# Altium schematic symbol library LATTICEPLDS_Library.SchLib: 291 symbols (part 13 of 32) (continued)
## LFE3-70/95/150EA-FN1156 (continued)
part D pins: AA25 PR64A*||PR82A*_RDQ67|RDQ85 (io), AA26 PR64B*||PR82B*_RDQ67|RDQ85 (io), AA27 PR70B*||PR88B*_RDQ67|RDQ85 (io), AA28 PR70A*||PR88A*_RDQ67|RDQ85 (io), AA29 PR58B||PR76B_RDQS58_N|RDQS76_N (io), AA30 PR65B*||PR83B*_RDQ67|RDQ85 (io), AA31 PR65A*||PR83A*_RDQ67|RDQ85 (io), AA33 PR61E_B,RLM1_GPLLT_FB_B||PR79E_B,RLM1_GPLLT_FB_B_RDQ58|RDQ76 (in), AA34 PR61E_A,RLM1_GPLLT_FB_A||PR79E_A,RLM1_GPLLT_FB_A_RDQ58|RDQ76 (in), AB23 VCCIO3 (power), AB24 VCCIO3 (power), AB25 NC||PR94B_|RDQS94_N (io), AB26 NC||PR94A_|RDQS94_P (io), AB27 NC||PR100B*_|RDQ103 (io), AB28 PR70E_C,RLM2_GPLLT_IN_A||PR97E_C,RLM3_GPLLT_IN_A_RDQ67|RDQ94 (in), AB29 PR70E_D,RLM2_GPLLT_IN_B||PR97E_D,RLM3_GPLLT_IN_B_RDQ67|RDQ94 (in), AB30 PR67A||PR85A_RDQS67_P|RDQS85_P (io), AB31 NC||PR89B_|RDQ94 (io), AB32 NC||PR89A_|RDQ94 (io), AB33 PR62B||PR80B_RDQ67|RDQ85 (io), AB34 PR62A||PR80A_RDQ67|RDQ85 (io), AC25 NC||PR103A_|RDQS103_P (io), AC26 NC||PR103B_|RDQS103_N (io), AC28 NC||PR100A*_|RDQ103 (io), AC30 PR67B||PR85B_RDQS67_N|RDQS85_N (io), AC31 PR70E_B,RLM2_GPLLT_FB_B||PR97E_B,RLM3_GPLLT_FB_B_RDQ67|RDQ94 (in), AC32 PR70E_A,RLM2_GPLLT_FB_A||PR97E_A,RLM3_GPLLT_FB_A_RDQ67|RDQ94 (in), AC33 PR68B||PR86B_RDQ67|RDQ85 (io), AC34 PR68A||PR86A_RDQ67|RDQ85 (io), AD25 NC||PR106B*_|RDQ103 (io), AD26 NC||PR106A*_|RDQ103 (io), AD30 NC||PR91B*_|RDQ94 (io), AD31 NC||PR91A*_|RDQ94 (io), AD33 NC||PR97A*_|RDQ94 (io), AD34 NC||PR97B*_|RDQ94 (io), AE26 PB145B||PB181B (io), AE29 PR74B*||PR101B*_RDQ76|RDQ103 (io), AE30 PR74A*||PR101A*_RDQ76|RDQ103 (io), AE31 PR71B||PR98B_RDQ76|RDQ103 (io), AE32 PR71A||PR98A_RDQ76|RDQ103 (io), AE33 NC||PR92B*_|RDQ94 (io), AE34 NC||PR92A*_|RDQ94 (io), AF26 PB145A||PB181A (io), AF31 PR77B||PR104B_RDQ76|RDQ103 (io), AF32 PR77A||PR104A_RDQ76|RDQ103 (io), AF34 NC||PR95A_|RDQ94 (io), AG26 PB136B||PB172B (io), AG34 NC||PR95B_|RDQ94 (io), AH26 PB136A||PB172A (io), AH27 PB142A||PB178A (io), AH28 PB142B||PB178B (io), AH33 PR82A*||PR109A*_RDQ85|RDQ112 (io), AJ27 PB139B||PB175B (io), AJ28 PB140B||PB176B (io), AJ31 PR88A*||PR115A*_RDQ85|RDQ112 (io), AJ33 PR82B*||PR109B*_RDQ85|RDQ112 (io), AJ34 PR79E_C,RLM3_GPLLT_IN_A||PR106E_C,RLM4_GPLLT_IN_A_RDQ76|RDQ103 (in), AK27 PB139A||PB175A (io), AK28 PB140A||PB176A (io), AK29 PB143B||PB179B (io), AK31 PR88B*||PR115B*_RDQ85|RDQ112 (io), AK32 PR86B||PR113B_RDQ85|RDQ112 (io), AK34 PR79E_D,RLM3_GPLLT_IN_B||PR106E_D,RLM4_GPLLT_IN_B_RDQ76|RDQ103 (in), AL27 PB134B||PB170B (io), AL28 PB137B||PB173B (io), AL29 PB143A||PB179A (io), AL30 PR91A*||PR118A*_RDQ94|RDQ121 (io), AL31 PR95A||PR122A_RDQ94|RDQ121 (io), AL32 PR86A||PR113A_RDQ85|RDQ112 (io), AL33 PR85B||PR112B_RDQS85_N|RDQS112_N (io), AL34 PR85A||PR112A_RDQS85_P|RDQS112_P (io), AM27 PB134A||PB170A (io), AM28 PB137A||PB173A (io), AM29 PR97A*||PR124A*_RDQ94|RDQ121 (io), AM30 PR91B*||PR118B*_RDQ94|RDQ121 (io), AM31 PR95B||PR122B_RDQ94|RDQ121 (io), AM32 PR89B||PR116B_RDQ94|RDQ121 (io), AM33 PR79E_B,RLM3_GPLLT_FB_B||PR106E_B,RLM4_GPLLT_FB_B_RDQ76|RDQ103 (in), AM34 PR79E_A,RLM3_GPLLT_FB_A||PR106E_A,RLM4_GPLLT_FB_A_RDQ76|RDQ103 (in), AN27 PB133B||PB169B (io), AN28 PB131B||PB167B (io), AN29 PR97B*||PR124B*_RDQ94|RDQ121 (io), AN31 PR92B*||PR119B*_RDQ94|RDQ121 (io), AN32 PR89A||PR116A_RDQ94|RDQ121 (io), AN33 PR80B||PR107B_RDQ85|RDQ112 (io), AN34 PR80A||PR107A_RDQ85|RDQ112 (io), AP27 PB133A||PB169A (io), AP28 PB131A||PB167A (io), AP29 PR94A||PR121A_RDQS94_P|RDQS121_P (io), AP30 PR94B||PR121B_RDQS94_N|RDQS121_N (io), AP31 PR92A*||PR119A*_RDQ94|RDQ121 (io), AP32 PR83B*||PR110B*_RDQ85|RDQ112 (io), AP33 PR83A*||PR110A*_RDQ85|RDQ112 (io), U28 PR46A*,PCLKT3_0||PR64A*,PCLKT3_0_RDQ49|RDQ67 (io), V23 VCCIO3 (power), V24 VCCIO3 (power), V26 PR49B||PR67B_RDQS49_N|RDQS67_N (io), V27 PR49A||PR67A_RDQS49_P|RDQS67_P (io), V28 PR46B*,PCLKC3_0||PR64B*,PCLKC3_0_RDQ49|RDQ67 (io), V29 PR52A*,VREF1_3||PR70A*,VREF1_3_RDQ49|RDQ67 (io), V30 PR44B||PR62B_RDQ49|RDQ67 (io), V31 PR44A||PR62A_RDQ49|RDQ67 (io), W26 PR55B*||PR73B*_RDQ58|RDQ76 (io), W27 PR55A*||PR73A*_RDQ58|RDQ76 (io), W28 PR52B*,VREF2_3||PR70B*,VREF2_3_RDQ49|RDQ67 (io), W29 PR53B||PR71B_RDQ58|RDQ76 (io), W30 PR53A||PR71A_RDQ58|RDQ76 (io), W31 PR50B||PR68B_RDQ49|RDQ67 (io), W32 PR50A||PR68A_RDQ49|RDQ67 (io), W33 PR47B*||PR65B*_RDQ49|RDQ67 (io), W34 PR47A*||PR65A*_RDQ49|RDQ67 (io), Y25 PR61B*||PR79B*_RDQ58|RDQ76 (io), Y26 PR61A*||PR79A*_RDQ58|RDQ76 (io), Y27 PR61E_D,RLM1_GPLLT_IN_B||PR79E_D,RLM1_GPLLT_IN_B_RDQ58|RDQ76 (in), Y28 PR61E_C,RLM1_GPLLT_IN_A||PR79E_C,RLM1_GPLLT_IN_A_RDQ58|RDQ76 (in), Y30 PR58A||PR76A_RDQS58_P|RDQS76_P (io), Y31 PR59B||PR77B_RDQ58|RDQ76 (io), Y32 PR59A||PR77A_RDQ58|RDQ76 (io), Y33 PR56B*||PR74B*_RDQ58|RDQ76 (io), Y34 PR56A*||PR74A*_RDQ58|RDQ76 (io)
part E pins: AA1 PL62B||PL80B_LDQ67|LDQ85 (io), AA2 PL62A||PL80A_LDQ67|LDQ85 (io), AA3 PL65B*||PL83B*_LDQ67|LDQ85 (io), AA4 PL65A*||PL83A*_LDQ67|LDQ85 (io), AA5 PL70A*||PL88A*_LDQ67|LDQ85 (io), AA7 PL64B*||PL82B*_LDQ67|LDQ85 (io), AA8 PL61B*||PL79B*_LDQ58|LDQ76 (io), AA9 NC||PL97A*_|LDQ94 (io), AA10 PL67A||PL85A_LDQS67_P|LDQS85_P (io), AB1 PL68B||PL86B_LDQ67|LDQ85 (io), AB2 PL68A||PL86A_LDQ67|LDQ85 (io), AB3 NC||PL89B_|LDQ94 (io), AB4 NC||PL89A_|LDQ94 (io), AB5 PL70B*||PL88B*_LDQ67|LDQ85 (io), AB6 NC||PL91B*_|LDQ94 (io), AB7 NC||PL91A*_|LDQ94 (io), AB8 NC||PL97B*_|LDQ94 (io), AB9 PL67B||PL85B_LDQS67_N|LDQS85_N (io), AB10 NC||PL100A*_|LDQ103 (io), AB11 VCCIO6 (power), AB12 VCCIO6 (power), AC1 NC||PL92B*_|LDQ94 (io), AC2 NC||PL92A*_|LDQ94 (io), AC4 NC||PL95B_|LDQ94 (io), AC5 NC||PL95A_|LDQ94 (io), AC6 PL70E_C,LLM2_GPLLT_IN_A||PL97E_C,LLM3_GPLLT_IN_A (in), AC7 PL70E_D,LLM2_GPLLT_IN_B||PL97E_D,LLM3_GPLLT_IN_B (in), AC8 NC||PL106B*_|LDQ103 (io), AC9 NC||PL106A*_|LDQ103 (io), AC10 NC||PL100B*_|LDQ103 (io), AD1 PL70E_B,LLM2_GPLLT_FB_B||PL97E_B,LLM3_GPLLT_FB_B (in), AD2 PL70E_A,LLM2_GPLLT_FB_A||PL97E_A,LLM3_GPLLT_FB_A (in), AD3 PL71B||PL98B_LDQ76|LDQ103 (io), AD4 PL71A||PL98A_LDQ76|LDQ103 (io), AD5 NC||PL94A_|LDQS94_P (io), AD8 PL82B*||PL109B*_LDQ85|LDQ112 (io), AD9 PL82A*||PL109A*_LDQ85|LDQ112 (io), AD10 PB4B||PB4B (io), AE1 PL74B*||PL101B*_LDQ76|LDQ103 (io), AE2 PL74A*||PL101A*_LDQ76|LDQ103 (io), AE3 PL77B||PL104B_LDQ76|LDQ103 (io), AE4 PL77A||PL104A_LDQ76|LDQ103 (io), AE5 NC||PL94B_|LDQS94_N (io), AE9 PB4A||PB4A (io), AF9 PB7A||PB7A (io), AG9 PB7B||PB7B (io), AH7 PB2A||PB2A (io), AH9 PB13A||PB13A (io), AJ1 NC||PL103A_|LDQS103_P (io), AJ2 PL85A||PL112A_LDQS85_P|LDQS112_P (io), AJ3 PL85B||PL112B_LDQS85_N|LDQS112_N (io), AJ4 PL88A*||PL115A*_LDQ85|LDQ112 (io), AJ5 PL91A*||PL118A*_LDQ94|LDQ121 (io), AJ6 PL91B*||PL118B*_LDQ94|LDQ121 (io), AJ7 PB2B||PB2B (io), AJ8 PB13B||PB13B (io), AK1 NC||PL103B_|LDQS103_N (io), AK3 PL86B||PL113B_LDQ85|LDQ112 (io), AK4 PL88B*||PL115B*_LDQ85|LDQ112 (io), AK6 PB5A||PB5A (io), AK7 PB8A||PB8A (io), AK8 PB10A||PB10A (io), AL1 PL79E_C,LLM3_GPLLT_IN_A||PL106E_C,LLM4_GPLLT_IN_A (in), AL2 PL79E_D,LLM3_GPLLT_IN_B||PL106E_D,LLM4_GPLLT_IN_B (in), AL3 PL86A||PL113A_LDQ85|LDQ112 (io), AL4 PL95A||PL122A_LDQ94|LDQ121 (io), AL5 PL92A*||PL119A*_LDQ94|LDQ121 (io), AL6 PB5B||PB5B (io), AL7 PB8B||PB8B (io), AL8 PB10B||PB10B (io), AM1 PL79E_A,LLM3_GPLLT_FB_A||PL106E_A,LLM4_GPLLT_FB_A (in), AM2 PL79E_B,LLM3_GPLLT_FB_B||PL106E_B,LLM4_GPLLT_FB_B (in), AM3 PL89B||PL116B_LDQ94|LDQ121 (io), AM4 PL95B||PL122B_LDQ94|LDQ121 (io), AM5 PL92B*||PL119B*_LDQ94|LDQ121 (io), AM6 PL94A||PL121A_LDQS94_P|LDQS121_P (io), AM7 PB11A||PB11A (io), AM8 PB11B||PB11B (io), AN1 PL80A||PL107A_LDQ85|LDQ112 (io), AN2 PL80B||PL107B_LDQ85|LDQ112 (io), AN3 PL89A||PL116A_LDQ94|LDQ121 (io), AN6 PL94B||PL121B_LDQS94_N|LDQS121_N (io), AN7 PB14A||PB14A (io), AN8 PB16A||PB16A (io), AP2 PL83A*||PL110A*_LDQ85|LDQ112 (io), AP3 PL83B*||PL110B*_LDQ85|LDQ112 (io), AP5 PL97A*||PL124A*_LDQ94|LDQ121 (io), AP6 PL97B*||PL124B*_LDQ94|LDQ121 (io), AP7 PB14B||PB14B (io), AP8 PB16B||PB16B (io), U1 PL44B||PL62B_LDQ49|LDQ67 (io), U2 PL44A||PL62A_LDQ49|LDQ67 (io), V1 PL47B*||PL65B*_LDQ49|LDQ67 (io), V2 PL47A*||PL65A*_LDQ49|LDQ67 (io), V3 PL50B||PL68B_LDQ49|LDQ67 (io), V4 PL50A||PL68A_LDQ49|LDQ67 (io), V5 PL49A||PL67A_LDQS49_P|LDQS67_P (io), V7 PL52A*,VREF1_6||PL70A*,VREF1_6_LDQ49|LDQ67 (io), V8 PL46B*,PCLKC6_0||PL64B*,PCLKC6_0_LDQ49|LDQ67 (io), V9 PL46A*,PCLKT6_0||PL64A*,PCLKT6_0_LDQ49|LDQ67 (io), V11 VCCIO6 (power), V12 VCCIO6 (power), W1 PL53B||PL71B_LDQ58|LDQ76 (io), W2 PL53A||PL71A_LDQ58|LDQ76 (io), W3 PL56B*||PL74B*_LDQ58|LDQ76 (io), W4 PL56A*||PL74A*_LDQ58|LDQ76 (io), W5 PL49B||PL67B_LDQS49_N|LDQS67_N (io), W6 PL58A||PL76A_LDQS58_P|LDQS76_P (io), W7 PL52B*,VREF2_6||PL70B*,VREF2_6_LDQ49|LDQ67 (io), W8 PL55A*||PL73A*_LDQ58|LDQ76 (io), W9 PL55B*||PL73B*_LDQ58|LDQ76 (io), Y1 PL59B||PL77B_LDQ58|LDQ76 (io), Y2 PL59A||PL77A_LDQ58|LDQ76 (io), Y4 PL61E_B,LLM1_GPLLT_FB_B||PL79E_B,LLM1_GPLLT_FB_B (in), Y5 PL61E_A,LLM1_GPLLT_FB_A||PL79E_A,LLM1_GPLLT_FB_A (in), Y6 PL58B||PL76B_LDQS58_N|LDQS76_N (io), Y7 PL64A*||PL82A*_LDQ67|LDQ85 (io), Y8 PL61A*||PL79A*_LDQ58|LDQ76 (io), Y9 PL61E_C,LLM1_GPLLT_IN_A||PL79E_C,LLM1_GPLLT_IN_A (in), Y10 PL61E_D,LLM1_GPLLT_IN_B||PL79E_D,LLM1_GPLLT_IN_B (in)
part F pins: E3 PL10B*||PL10B*_LDQ13|LDQ13 (io), F1 PL8B||PL8B_LDQ13|LDQ13 (io), F2 PL8A||PL8A_LDQ13|LDQ13 (io), F3 PL10A*||PL10A*_LDQ13|LDQ13 (io), G1 PL11B*||PL11B*_LDQ13|LDQ13 (io), G2 PL11A*||PL11A*_LDQ13|LDQ13 (io), G3 PL13A||PL13A_LDQS13_P|LDQS13_P (io), G4 PL2A||PL2A (io), G5 PL2B||PL2B (io), H1 PL14A||PL14A_LDQ13|LDQ13 (io), H2 PL16B*||PL16B*_LDQ13|LDQ13 (io), H3 PL13B||PL13B_LDQS13_N|LDQS13_N (io), H4 PL5B||PL5B (io), H5 PL5A||PL5A (io), J1 PL14B||PL14B_LDQ13|LDQ13 (io), J3 PL16A*||PL16A*_LDQ13|LDQ13 (io), J6 NC||PL19B*_|LDQ22 (io), K1 NC||PL20B*_|LDQ22 (io), K2 NC||PL20A*_|LDQ22 (io), K3 NC||PL17B_|LDQ22 (io), K4 NC||PL17A_|LDQ22 (io), K5 NC||PL28B*_|LDQ31 (io), K6 NC||PL28A*_|LDQ31 (io), K7 NC||PL19A*_|LDQ22 (io), K8 PL4B*||NC, K9 PL4A*||NC, L1 NC||PL23B_|LDQ22 (io), L2 NC||PL23A_|LDQ22 (io), L4 NC||PL26B_|LDQ31 (io), L5 NC||PL26A_|LDQ31 (io), L6 NC||PL34B*_|LDQ31 (io), L7 NC||PL25B*_|LDQ22 (io), L9 NC||PL22B_|LDQS22_N (io), L10 NC||PL22A_|LDQS22_P (io), M1 NC||PL32B_|LDQ31 (io), M2 NC||PL32A_|LDQ31 (io), M3 NC||PL29B*_|LDQ31 (io), M4 NC||PL29A*_|LDQ31 (io), M5 PL19A*||PL37A*_LDQ22|LDQ40 (io), M7 NC||PL34A*_|LDQ31 (io), M8 NC||PL25A*_|LDQ22 (io), M9 NC||PL31B_|LDQS31_N (io), M10 PL22A||PL40A_LDQS22_P|LDQS40_P (io), N1 PL20B*||PL38B*_LDQ22|LDQ40 (io), N2 PL20A*||PL38A*_LDQ22|LDQ40 (io), N3 PL17B||PL35B_LDQ22|LDQ40 (io), N4 PL17A||PL35A_LDQ22|LDQ40 (io), N5 PL19B*||PL37B*_LDQ22|LDQ40 (io), N6 PL25E_D,LUM2_GPLLT_IN_B||PL43E_D,LUM2_GPLLT_IN_B (in), N7 PL25E_C,LUM2_GPLLT_IN_A||PL43E_C,LUM2_GPLLT_IN_A (in), N8 PL25A*||PL43A*_LDQ22|LDQ40 (io), N9 NC||PL31A_|LDQS31_P (io), N10 PL22B||PL40B_LDQS22_N|LDQS40_N (io), N11 VCCIO7 (power), N12 VCCIO7 (power), P1 PL25E_B,LUM2_GPLLT_FB_B||PL43E_B,LUM2_GPLLT_FB_B (in), P2 PL25E_A,LUM2_GPLLT_FB_A||PL43E_A,LUM2_GPLLT_FB_A (in), P4 PL23B||PL41B_LDQ22|LDQ40 (io), P5 PL23A||PL41A_LDQ22|LDQ40 (io), P6 PL31B||PL49B_LDQS31_N|LDQS49_N (io), P7 PL31A||PL49A_LDQS31_P|LDQS49_P (io), P8 PL25B*||PL43B*_LDQ22|LDQ40 (io), P9 PL28A*||PL46A*_LDQ31|LDQ49 (io), P10 PL28B*||PL46B*_LDQ31|LDQ49 (io), R1 PL29B*||PL47B*_LDQ31|LDQ49 (io), R2 PL29A*||PL47A*_LDQ31|LDQ49 (io), R3 PL32B||PL50B_LDQ31|LDQ49 (io), R4 PL32A||PL50A_LDQ31|LDQ49 (io), R5 PL26B||PL44B_LDQ31|LDQ49 (io), R7 PL26A||PL44A_LDQ31|LDQ49 (io), R8 PL37A*,LUM0_GDLLT_IN_A||PL55A*,LUM0_GDLLT_IN_A_LDQ40|LDQ58 (io), R9 PL34A*,VREF1_7||PL52A*,VREF1_7_LDQ31|LDQ49 (io), R10 PL34B*,VREF2_7||PL52B*,VREF2_7_LDQ31|LDQ49 (io), T1 PL41B||PL59B_LDQ40|LDQ58 (io), T2 PL41A||PL59A_LDQ40|LDQ58 (io), T3 PL38B*,LUM0_GDLLT_FB_B||PL56B*,LUM0_GDLLT_FB_B_LDQ40|LDQ58 (io), T4 PL38A*,LUM0_GDLLT_FB_A||PL56A*,LUM0_GDLLT_FB_A_LDQ40|LDQ58 (io), T5 PL35B||PL53B_LDQ40|LDQ58 (io), T6 PL35A||PL53A_LDQ40|LDQ58 (io), T7 PL37B*,LUM0_GDLLT_IN_B||PL55B*,LUM0_GDLLT_IN_B_LDQ40|LDQ58 (io), T8 PL40B||PL58B_LDQS40_N|LDQS58_N (io), T9 PL40A||PL58A_LDQS40_P|LDQS58_P (io), U4 PL43E_B,LUM0_GPLLT_FB_B||PL61E_B,LUM0_GPLLT_FB_B (in), U5 PL43E_A,LUM0_GPLLT_FB_A||PL61E_A,LUM0_GPLLT_FB_A (in), U6 PL43E_C,LUM0_GPLLT_IN_A||PL61E_C,LUM0_GPLLT_IN_A (in), U7 PL43E_D,LUM0_GPLLT_IN_B||PL61E_D,LUM0_GPLLT_IN_B (in), U8 PL43B*,PCLKC7_0||PL61B*,PCLKC7_0_LDQ40|LDQ58 (io), U9 PL43A*,PCLKT7_0||PL61A*,PCLKT7_0_LDQ40|LDQ58 (io), U11 VCCIO7 (power), U12 VCCIO7 (power)
part G pins: A32 PT140A||PT176A (io), A33 PT140B||PT176B (io), B32 PT143A||PT179A (io), B33 CFG0 (in), B34 PROGRAMN||PROGRAMN (in), C1 TDO (out), C31 PT145B||PT181B (io), C32 PT143B||PT179B (io), C33 INITN (io), C34 CCLK (in), D1 TCK (in), D2 TMS (in), D29 PT142B||PT178B (io), D30 PT142A||PT178A (io), D31 PT145A||PT181A (io), D32 CFG2 (in), D33 PR5A||PR5A (io), D34 PR5B,DI/CSSPI0N/CSSPIN||PR5B,DI/CSSPI0N/CSSPIN (io), E1 TDI (in), E31 PR10A,WRITEN||PR10A,WRITEN (io), E32 PR10B,D0/SPIFASTN||PR10B,D0/SPIFASTN (io), E34 PR8A,DOUT/CSON/CSSPI1N||PR8A,DOUT/CSON/CSSPI1N (io), F30 CFG1 (in), F31 PR7B,CSN/SN/CONT1N||PR7B,CSN/SN/CONT1N (io), F32 PR16A,D7/SPID0||PR16A,D7/SPID0 (io), F33 PR16B,BUSY/SISPI||PR16B,BUSY/SISPI (io), F34 PR8B,MCLK||PR8B (io), G30 PR7A,CS1N/HOLDN/CONT2N||PR7A,CS1N/HOLDN/CONT2N (io), G31 DONE (io), G32 PR13B,D4/SO||PR13B,D4/SO (io), G33 PR13A,D3/SI||PR13A,D3/SI (io), G34 PR11A,D1||PR11A,D1 (io), H33 PR11B,D2||PR11B,D2 (io), H34 PR14A,D5||PR14A,D5 (io), J34 PR14B,D6/SPID1||PR14B,D6/SPID1 (io), K10 VCCJ (power), N25 VCCIO8||VCCIO8 (power), P25 VCCIO8||VCCIO8 (power)
part H pins: AE14 NC||PCSD_VCCOB0 (power), AE15 NC||PCSD_VCCIB0 (power), AE20 PCSC_VCCIB3||PCSC_VCCIB3 (power), AE21 PCSC_VCCOB3||PCSC_VCCOB3 (power), AF11 NC||PCSD_VCCIB3 (power), AF12 NC||PCSD_VCCIB2 (power), AF13 NC||PCSD_VCCIB1 (power), AF14 PCSB_VCCIB3||PCSB_VCCIB3 (power), AF15 PCSB_VCCIB2||PCSB_VCCIB2 (power), AF16 PCSB_VCCIB1||PCSB_VCCIB1 (power), AF17 PCSB_VCCIB0||PCSB_VCCIB0 (power), AF18 PCSA_VCCIB3||PCSA_VCCIB3 (power), AF19 PCSA_VCCIB2||PCSA_VCCIB2 (power), AF20 PCSA_VCCIB1||PCSA_VCCIB1 (power), AF21 PCSA_VCCIB0||PCSA_VCCIB0 (power), AF22 PCSC_VCCIB2||PCSC_VCCIB2 (power), AF23 PCSC_VCCIB1||PCSC_VCCIB1 (power), AF24 PCSC_VCCIB0||PCSC_VCCIB0 (power), AG11 NC||PCSD_VCCOB3 (power), AG12 NC||PCSD_VCCOB2 (power), AG13 NC||PCSD_VCCOB1 (power), AG14 PCSB_VCCOB3||PCSB_VCCOB3 (power), AG15 PCSB_VCCOB2||PCSB_VCCOB2 (power), AG16 PCSB_VCCOB1||PCSB_VCCOB1 (power), AG17 PCSB_VCCOB0||PCSB_VCCOB0 (power), AG18 PCSA_VCCOB3||PCSA_VCCOB3 (power), AG19 PCSA_VCCOB2||PCSA_VCCOB2 (power), AG20 PCSA_VCCOB1||PCSA_VCCOB1 (power), AG21 PCSA_VCCOB0||PCSA_VCCOB0 (power), AG22 PCSC_VCCOB2||PCSC_VCCOB2 (power), AG23 PCSC_VCCOB1||PCSC_VCCOB1 (power), AG24 PCSC_VCCOB0||PCSC_VCCOB0 (power), AH12 NC||PCSD_REFCLKP (in), AH13 NC||PCSD_REFCLKN (in), AH15 PCSB_REFCLKP||PCSB_REFCLKP (in), AH16 PCSB_REFCLKN||PCSB_REFCLKN (in), AH19 PCSA_REFCLKP||PCSA_REFCLKP (in), AH20 PCSA_REFCLKN||PCSA_REFCLKN (in), AH22 PCSC_REFCLKP||PCSC_REFCLKP (in), AH23 PCSC_REFCLKN||PCSC_REFCLKN (in), AK10 NC||PCSD_HDINN3 (in), AK11 NC||PCSD_HDINN2 (in), AK12 NC||PCSD_HDINN1 (in), AK13 NC||PCSD_HDINN0 (in), AK14 PCSB_HDINN3||PCSB_HDINN3 (in), AK15 PCSB_HDINN2||PCSB_HDINN2 (in), AK16 PCSB_HDINN1||PCSB_HDINN1 (in), AK17 PCSB_HDINN0||PCSB_HDINN0 (in), AK18 PCSA_HDINN3||PCSA_HDINN3 (in), AK19 PCSA_HDINN2||PCSA_HDINN2 (in), AK20 PCSA_HDINN1||PCSA_HDINN1 (in), AK21 PCSA_HDINN0||PCSA_HDINN0 (in), AK22 PCSC_HDINN3||PCSC_HDINN3 (in), AK23 PCSC_HDINN2||PCSC_HDINN2 (in), AK24 PCSC_HDINN1||PCSC_HDINN1 (in), AK25 PCSC_HDINN0||PCSC_HDINN0 (in), AL10 NC||PCSD_HDINP3 (in), AL11 NC||PCSD_HDINP2 (in), AL12 NC||PCSD_HDINP1 (in), AL13 NC||PCSD_HDINP0 (in), AL14 PCSB_HDINP3||PCSB_HDINP3 (in), AL15 PCSB_HDINP2||PCSB_HDINP2 (in), AL16 PCSB_HDINP1||PCSB_HDINP1 (in), AL17 PCSB_HDINP0||PCSB_HDINP0 (in), AL18 PCSA_HDINP3||PCSA_HDINP3 (in), AL19 PCSA_HDINP2||PCSA_HDINP2 (in), AL20 PCSA_HDINP1||PCSA_HDINP1 (in), AL21 PCSA_HDINP0||PCSA_HDINP0 (in), AL22 PCSC_HDINP3||PCSC_HDINP3 (in), AL23 PCSC_HDINP2||PCSC_HDINP2 (in), AL24 PCSC_HDINP1||PCSC_HDINP1 (in), AL25 PCSC_HDINP0||PCSC_HDINP0 (in), AN10 NC||PCSD_HDOUTN3 (out), AN11 NC||PCSD_HDOUTN2 (out), AN12 NC||PCSD_HDOUTN1 (out), AN13 NC||PCSD_HDOUTN0 (out), AN14 PCSB_HDOUTN3||PCSB_HDOUTN3 (out), AN15 PCSB_HDOUTN2||PCSB_HDOUTN2 (out), AN16 PCSB_HDOUTN1||PCSB_HDOUTN1 (out), AN17 PCSB_HDOUTN0||PCSB_HDOUTN0 (out), AN18 PCSA_HDOUTN3||PCSA_HDOUTN3 (out), AN19 PCSA_HDOUTN2||PCSA_HDOUTN2 (out), AN20 PCSA_HDOUTN1||PCSA_HDOUTN1 (out), AN21 PCSA_HDOUTN0||PCSA_HDOUTN0 (out), AN22 PCSC_HDOUTN3||PCSC_HDOUTN3 (out), AN23 PCSC_HDOUTN2||PCSC_HDOUTN2 (out), AN24 PCSC_HDOUTN1||PCSC_HDOUTN1 (out), AN25 PCSC_HDOUTN0||PCSC_HDOUTN0 (out), AP10 NC||PCSD_HDOUTP3 (out), AP11 NC||PCSD_HDOUTP2 (out), AP12 NC||PCSD_HDOUTP1 (out), AP13 NC||PCSD_HDOUTP0 (out), AP14 PCSB_HDOUTP3||PCSB_HDOUTP3 (out), AP15 PCSB_HDOUTP2||PCSB_HDOUTP2 (out), AP16 PCSB_HDOUTP1||PCSB_HDOUTP1 (out), AP17 PCSB_HDOUTP0||PCSB_HDOUTP0 (out), AP18 PCSA_HDOUTP3||PCSA_HDOUTP3 (out), AP19 PCSA_HDOUTP2||PCSA_HDOUTP2 (out), AP20 PCSA_HDOUTP1||PCSA_HDOUTP1 (out), AP21 PCSA_HDOUTP0||PCSA_HDOUTP0 (out), AP22 PCSC_HDOUTP3||PCSC_HDOUTP3 (out), AP23 PCSC_HDOUTP2||PCSC_HDOUTP2 (out), AP24 PCSC_HDOUTP1||PCSC_HDOUTP1 (out), AP25 PCSC_HDOUTP0||PCSC_HDOUTP0 (out)
part I pins: A1 GND (power), A34 GND (power), AA6 GND (power), AA11 GND (power), AA14 GND (power), AA15 GND (power), AA16 GND (power), AA17 GND (power), AA18 GND (power), AA19 GND (power), AA20 GND (power), AA21 GND (power), AA24 GND (power), AA32 GND (power), AC3 GND (power), AC11 GND (power), AC12 GND (power), AC16 GND (power), AC19 GND (power), AC23 GND (power), AC24 GND (power), AC29 GND (power), AD6 GND (power), AD11 GND (power), AD12 GND (power), AD14 GND (power), AD15 GND (power), AD20 GND (power), AD21 GND (power), AD23 GND (power), AD24 GND (power), AD32 GND (power), AE10 GND (power), AE11 GND (power), AE17 GND (power), AE18 GND (power), AE24 GND (power), AE25 GND (power), AF2 GND (power), AF5 GND (power), AF10 GND (power), AF25 GND (power), AF30 GND (power), AF33 GND (power), AG8 GND (power), AG10 GND (power), AG25 GND (power), AG27 GND (power), AH10 GND (power), AH11 GND (power), AH14 GND (power), AH17 GND (power), AH18 GND (power), AH21 GND (power), AH24 GND (power), AH25 GND (power), AJ9 GND (power), AJ10 GND (power), AJ11 GND (power), AJ12 GND (power), AJ13 GND (power), AJ14 GND (power), AJ15 GND (power), AJ16 GND (power), AJ17 GND (power), AJ18 GND (power), AJ19 GND (power), AJ20 GND (power), AJ21 GND (power), AJ22 GND (power), AJ23 GND (power), AJ24 GND (power), AJ25 GND (power), AJ26 GND (power), AK2 GND (power), AK5 GND (power), AK9 GND (power), AK26 GND (power), AK30 GND (power), AK33 GND (power), AL9 GND (power), AL26 GND (power), AM9 GND (power), AM10 GND (power), AM11 GND (power), AM12 GND (power), AM13 GND (power), AM14 GND (power), AM15 GND (power), AM16 GND (power), AM17 GND (power), AM18 GND (power), AM19 GND (power), AM20 GND (power), AM21 GND (power), AM22 GND (power), AM23 GND (power), AM24 GND (power), AM25 GND (power), AM26 GND (power), AN5 GND (power), AN9 GND (power), AN26 GND (power), AN30 GND (power), AP1 GND (power), AP9 GND (power), AP26 GND (power), AP34 GND (power), B5 GND (power), B9 GND (power), B26 GND (power), B30 GND (power), C12 GND (power), C15 GND (power), C18 GND (power), C21 GND (power), C24 GND (power), E2 GND (power), E5 GND (power), E9 GND (power), E26 GND (power), E30 GND (power), E33 GND (power), F11 GND (power), F14 GND (power), F17 GND (power), F20 GND (power), F23 GND (power), H8 GND (power), H27 GND (power), J2 GND (power), J5 GND (power), J30 GND (power), J33 GND (power), K17 GND (power), K18 GND (power), L3 GND (power), L11 GND (power), L12 GND (power), L14 GND (power), L15 GND (power), L20 GND (power), L21 GND (power), L23 GND (power), L24 GND (power), L29 GND (power), M6 GND (power), M11 GND (power), M12 GND (power), M16 GND (power), M19 GND (power), M23 GND (power), M24 GND (power), M32 GND (power), P3 GND (power), P11 GND (power), P14 GND (power), P15 GND (power), P16 GND (power), P17 GND (power), P18 GND (power), P19 GND (power), P20 GND (power), P21 GND (power), P24 GND (power), P29 GND (power), R6 GND (power), R11 GND (power), R14 GND (power), R15 GND (power), R16 GND (power), R17 GND (power), R18 GND (power), R19 GND (power), R20 GND (power), R21 GND (power), R24 GND (power), R32 GND (power), T12 GND (power), T14 GND (power), T15 GND (power), T16 GND (power), T17 GND (power), T18 GND (power), T19 GND (power), T20 GND (power), T21 GND (power), T23 GND (power), U3 GND (power), U10 GND (power), U14 GND (power), U15 GND (power), U16 GND (power), U17 GND (power), U18 GND (power), U19 GND (power), U20 GND (power), U21 GND (power), U25 GND (power), U29 GND (power), V6 GND (power), V10 GND (power), V14 GND (power), V15 GND (power), V16 GND (power), V17 GND (power), V18 GND (power), V19 GND (power), V20 GND (power), V21 GND (power), V25 GND (power), V32 GND (power), W12 GND (power), W14 GND (power), W15 GND (power), W16 GND (power), W17 GND (power), W18 GND (power), W19 GND (power), W20 GND (power), W21 GND (power), Y3 GND (power), Y11 GND (power), Y14 GND (power), Y15 GND (power), Y16 GND (power), Y17 GND (power), Y18 GND (power), Y19 GND (power), Y20 GND (power), Y21 GND (power), Y24 GND (power), Y29 GND (power)
part J pins: AC27 NC, AD7 NC, AD27 NC, AD28 NC, AD29 NC, AE6 NC, AE7 NC, AE8 NC, AE27 NC, AE28 NC, AF1 NC, AF3 NC, AF4 NC, AF6 NC, AF7 NC, AF8 NC, AF27 NC, AF28 NC, AF29 NC, AG1 NC, AG2 NC, AG3 NC, AG4 NC, AG5 NC, AG6 NC, AG7 NC, AG28 NC, AG29 NC, AG30 NC, AG31 NC, AG32 NC, AG33 NC, AH1 NC, AH2 NC, AH3 NC, AH4 NC, AH5 NC, AH6 NC, AH8 NC, AH29 NC, AH30 NC, AH31 NC, AH32 NC, AH34 NC, AJ29 NC, AJ30 NC, AJ32 NC, AN4 RESERVE (in), AP4 RESERVE (in), B29 NC, C7 NC, D7 NC, D8 NC, E6 NC, E7 NC, E8 NC, E14 NC, E25 NC, E28 NC, E29 NC, F4 NC, F5 NC, F6 NC, F7 NC, F8 NC, F9 NC, F15 NC, F24 NC, F25 NC, F26 NC, F27 NC, F28 NC, F29 NC, G6 NC, G7 NC, G8 NC, G9 NC, G10 NC, G14 NC, G15 NC, G22 NC, G24 NC, G27 NC, G28 NC, G29 NC, H6 NC, H7 NC, H9 NC, H10 NC, H21 NC, H24 NC, H28 NC, H29 NC, H30 NC, H31 NC, H32 NC, J4 NC, J7 NC, J8 NC, J9 NC, J10 NC, J24 NC, J25 NC, J26 NC, J27 NC, J28 NC, J29 NC, J31 NC, J32 NC, K25 NC, K26 NC, K27 NC, K28 NC, L8 NC, L25 NC, L27 NC
part K pins: AA12 VCCAUX (power), AA13 VCC (power), AA22 VCC (power), AA23 VCCAUX (power), AB13 VCC (power), AB14 VCC (power), AB15 VCC (power), AB16 VCC (power), AB17 VCC (power), AB18 VCC (power), AB19 VCC (power), AB20 VCC (power), AB21 VCC (power), AB22 VCC (power), AC13 VCCA (power), AC14 VCCAUX (power), AC15 VCCAUX (power), AC17 VCCA (power), AC18 VCCA (power), AC20 VCCAUX (power), AC21 VCCAUX (power), AC22 VCCA (power), AD13 VCCA (power), AD16 VCCA (power), AD17 VCCA (power), AD18 VCCA (power), AD19 VCCA (power), AD22 VCCA (power), AE12 VCCA (power), AE13 VCCA (power), AE16 VCCA (power), AE19 VCCA (power), AE22 VCCA (power), AE23 VCCA (power), M14 VCCAUX (power), M15 VCCAUX (power), M20 VCCAUX (power), M21 VCCAUX (power), N13 VCC (power), N14 VCC (power), N15 VCC (power), N16 VCC (power), N17 VCC (power), N18 VCC (power), N19 VCC (power), N20 VCC (power), N21 VCC (power), N22 VCC (power), P12 VCCAUX (power), P13 VCC (power), P22 VCC (power), P23 VCCAUX (power), R12 VCCAUX (power), R13 VCC (power), R22 VCC (power), R23 VCCAUX (power), T10 VTT7 (power), T11 VTT7 (power), T13 VCCPLL_L (power), T22 VCCPLL_R (power), T24 VTT2 (power), T25 VTT2 (power), U13 VCC (power), U22 VCC (power), V13 VCC (power), V22 VCC (power), W10 VTT6 (power), W11 VTT6 (power), W13 VCCPLL_L (power), W22 VCCPLL_R (power), W23 XRES (in), W24 VTT3 (power), W25 VTT3 (power), Y12 VCCAUX (power), Y13 VCC (power), Y22 VCC (power), Y23 VCCAUX (power)

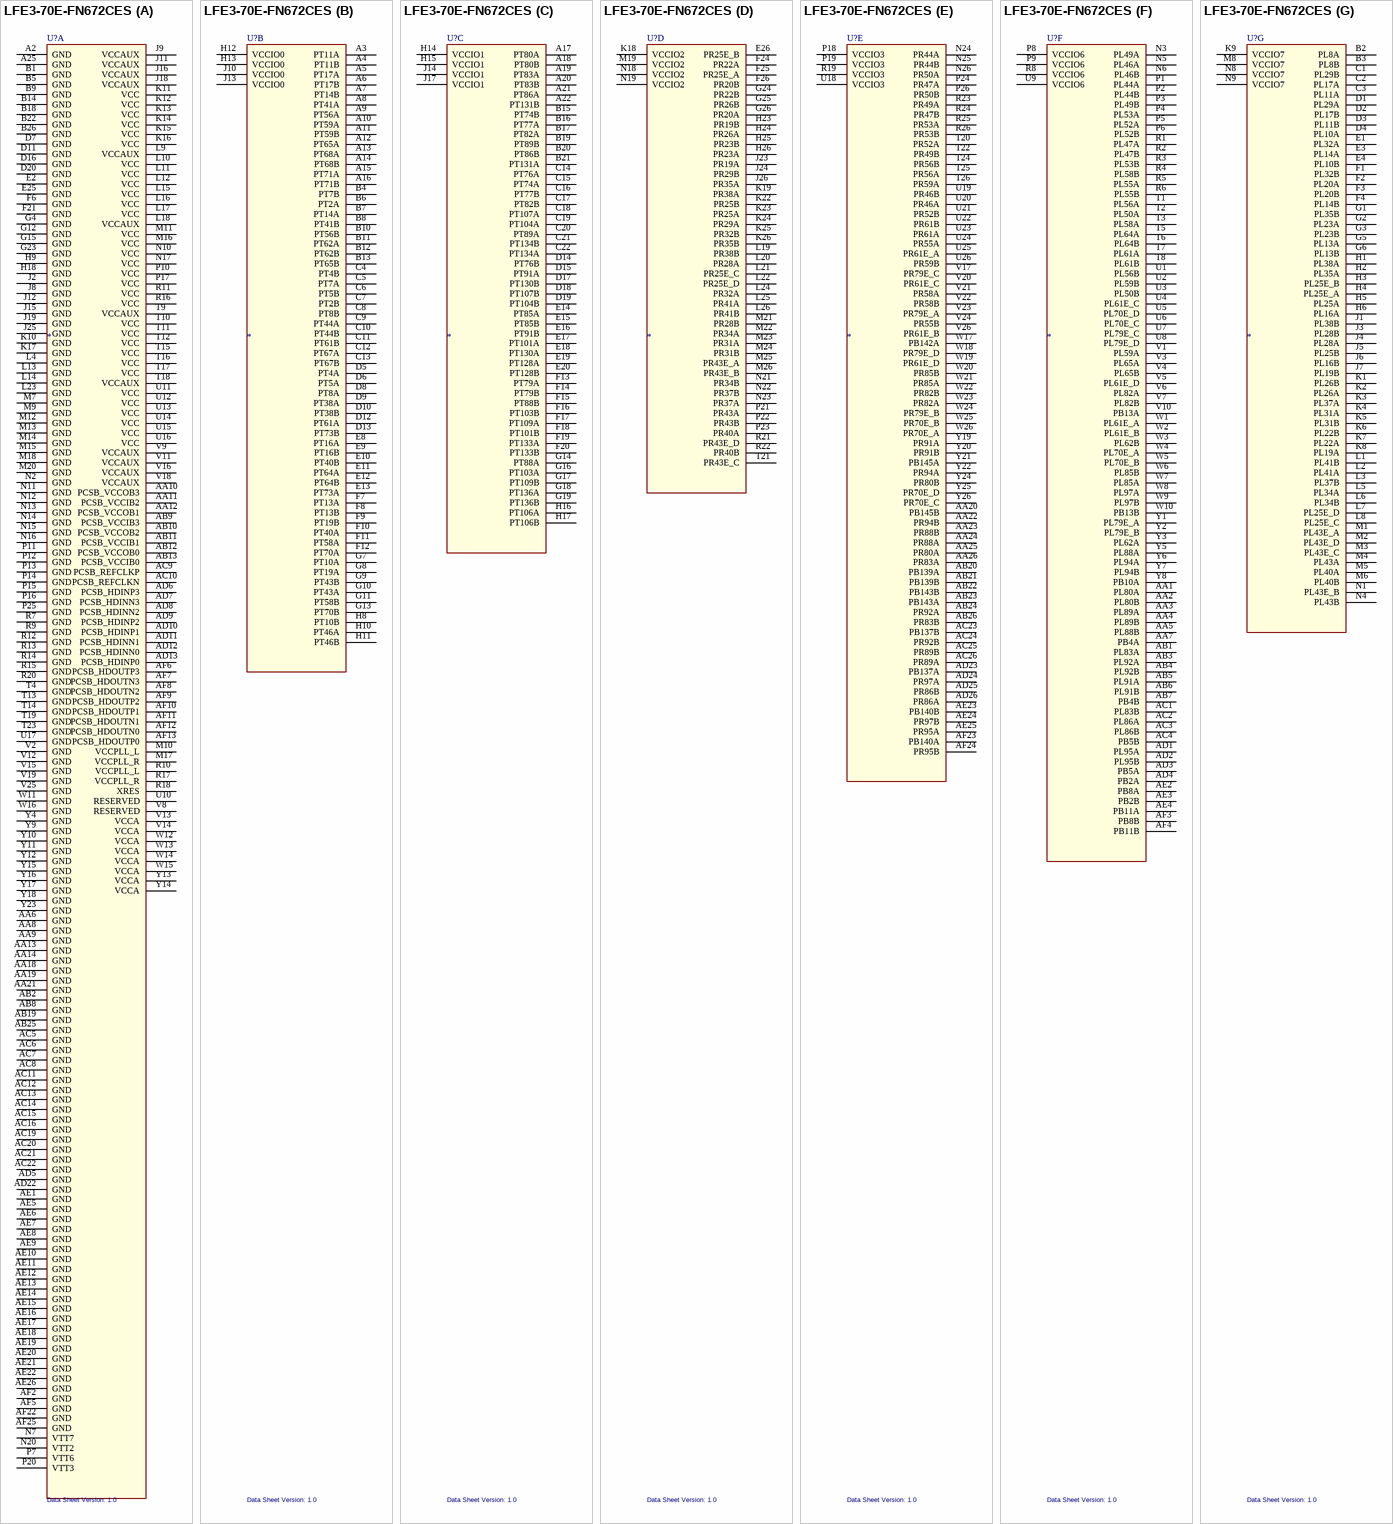
[diagram p136: symbol LFE3-70E-FN672CES]

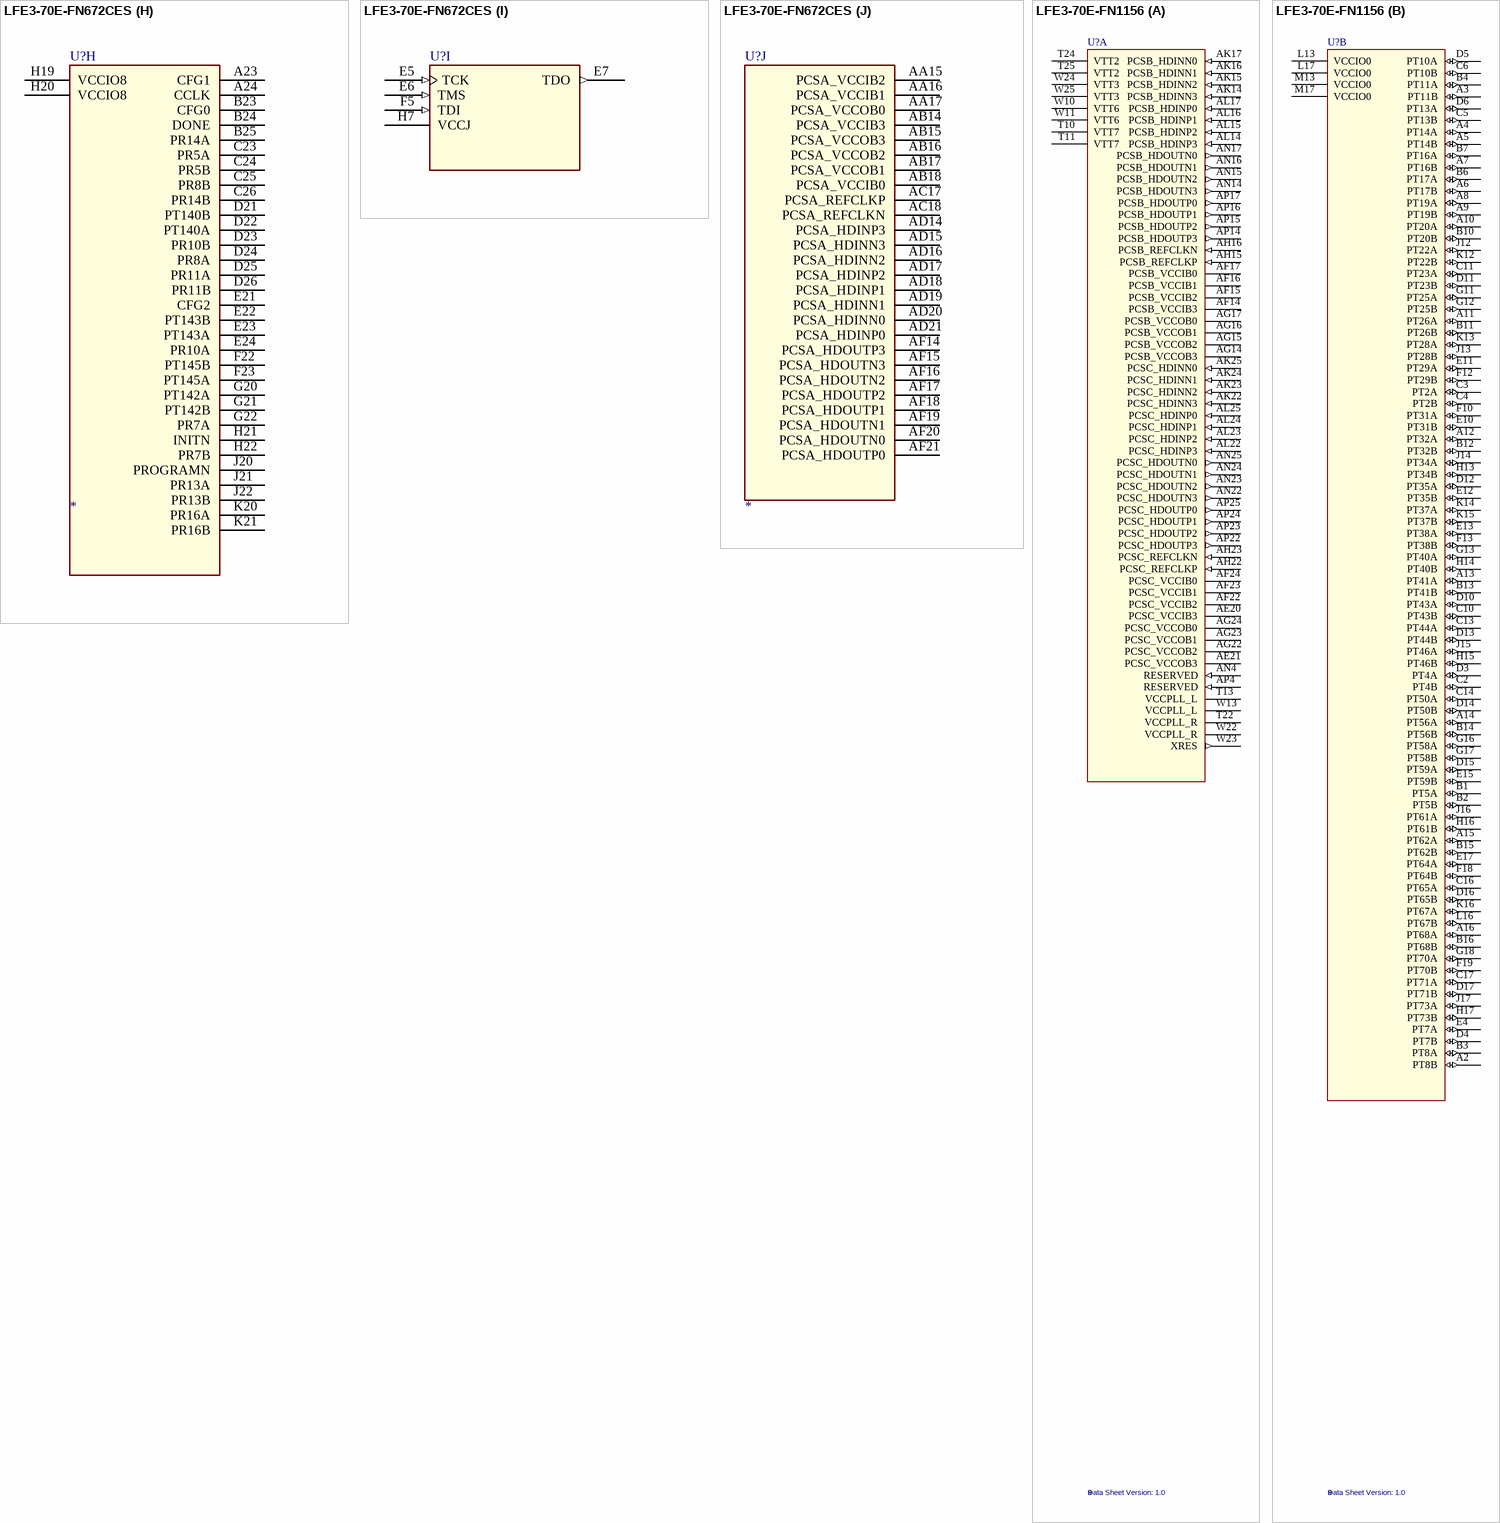
[diagram p137: symbols LFE3-70E-FN672CES to LFE3-70E-FN1156]